# Altium footprint library Connectors_2,54mm.PcbLib: 400 footprints (part 15 of 26)
Each footprint in its own frame and in the unit in brackets; x right, y up, seen from the top. Pads: shape width x height; smd on the part's side, far side on the other; paste and mask are expansions set on the pad; w line width, h text height; cw(c..) or ccw(c..) is an arc to the next point about the centre after c.
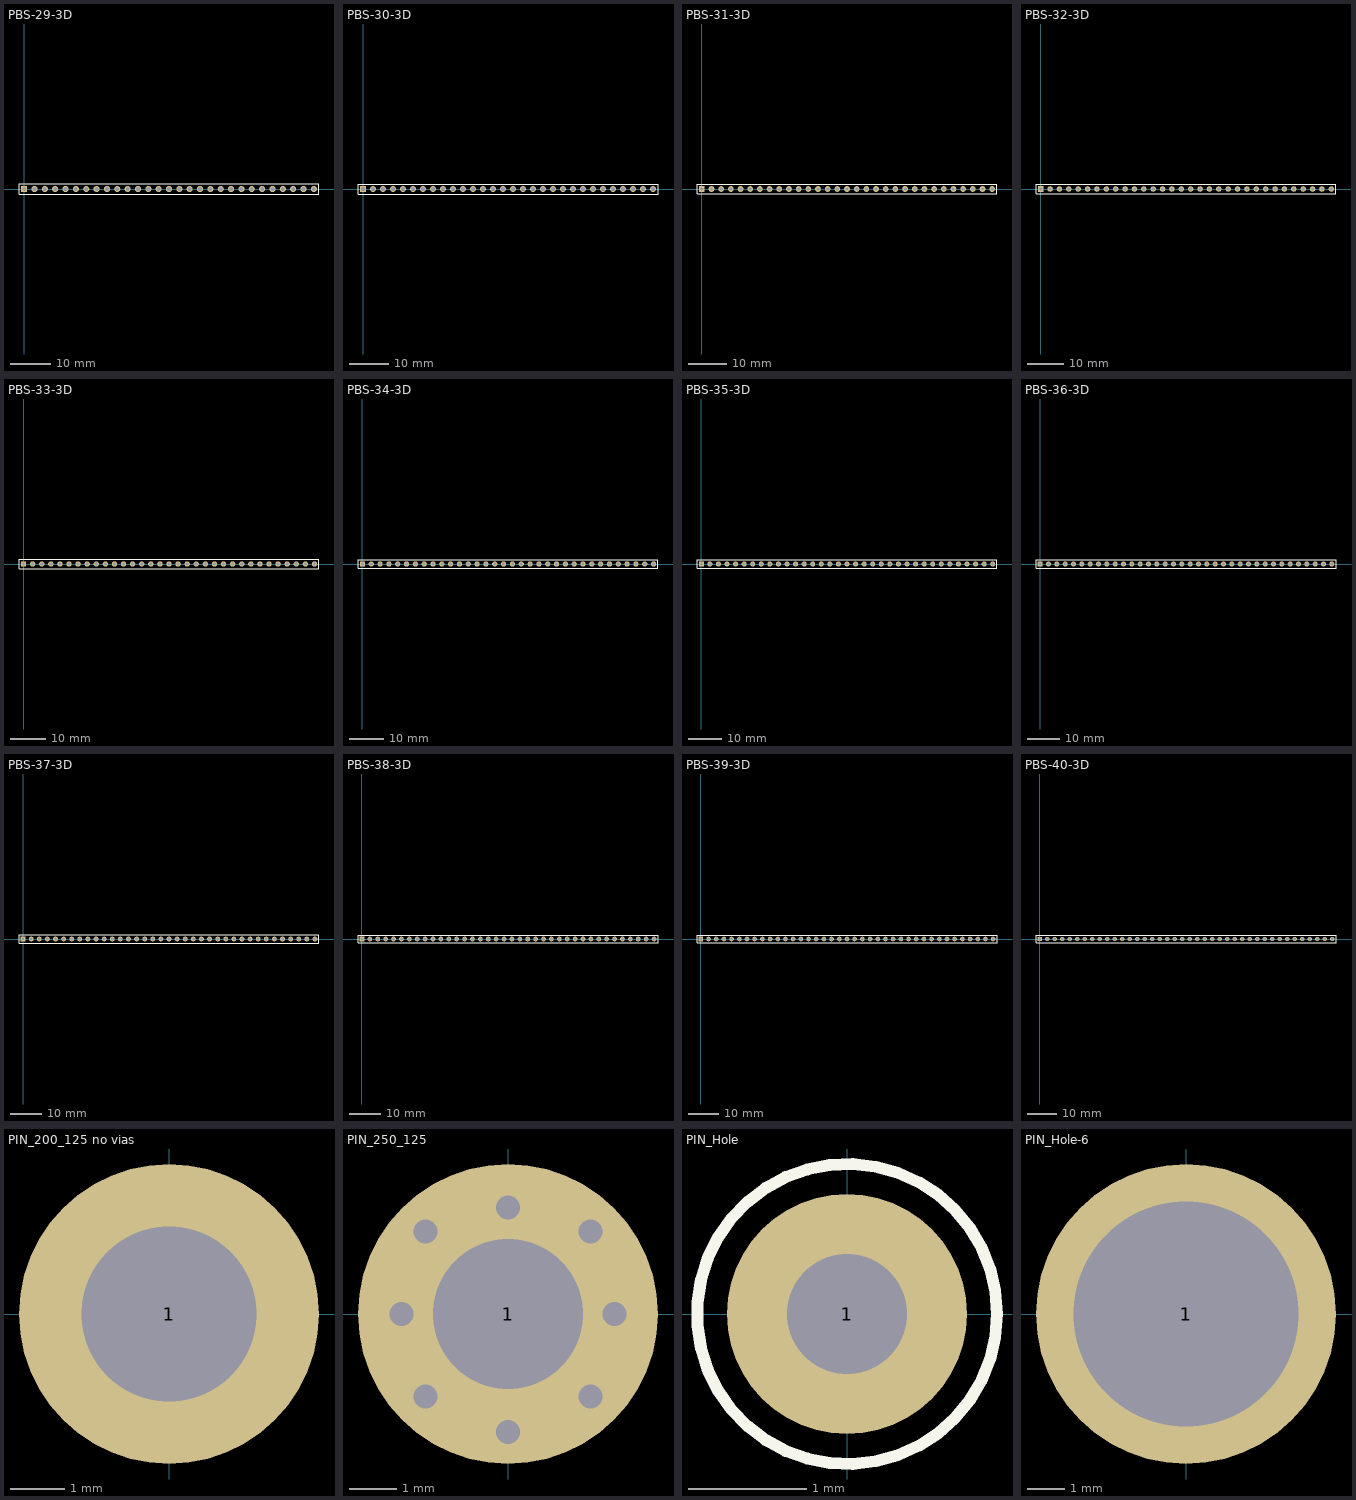
[diagram p14: the footprints below, top view; thin cyan lines are the x and y axes]

## PBS-29-3D [mm] "Connector; Header; 29 Position"
height 8
pads (29):
  rect 1.5x1.5 hole 0.9: 1(0,0)
  round 1.5 hole 0.9: 2(2.54,0) 3(5.08,0) 4(7.62,0) 5(10.16,0) 6(12.7,0) 7(15.24,0) 8(17.78,0) 9(20.32,0) 10(22.86,0) 11(25.4,0) 12(27.94,0) 13(30.48,0) 14(33.02,0) 15(35.56,0) 16(38.1,0) 17(40.64,0) 18(43.18,0) 19(45.72,0) 20(48.26,0) 21(50.8,0) 22(53.34,0) 23(55.88,0) 24(58.42,0) 25(60.96,0) 26(63.5,0) 27(66.04,0) 28(68.58,0) 29(71.12,0)
Top Overlay:
  lines w0.2: -1.27,-1.27 -1.27,1.27 72.39,1.27 72.39,-1.27 -1.27,-1.27
3D body "PBD-2.stp": height 8.5, standoff -3.15, extent 64.77,-1.27 69.85,1.27
3D body "PBD-2.stp": height 8.5, standoff -3.15, extent 59.69,-1.27 64.77,1.27
3D body "PBD-2.stp": height 8.5, standoff -3.15, extent 54.61,-1.27 59.69,1.27
3D body "PBD-2.stp": height 8.5, standoff -3.15, extent 49.53,-1.27 54.61,1.27
3D body "PBD-2.stp": height 8.5, standoff -3.15, extent 44.45,-1.27 49.53,1.27
3D body "PBD-2.stp": height 8.5, standoff -3.15, extent 39.37,-1.27 44.45,1.27
3D body "PBD-2.stp": height 8.5, standoff -3.15, extent 34.29,-1.27 39.37,1.27
3D body "PBD-2.stp": height 8.5, standoff -3.15, extent 29.21,-1.27 34.29,1.27
3D body "PBD-2.stp": height 8.5, standoff -3.15, extent 24.13,-1.27 29.21,1.27
3D body "PBD-2.stp": height 8.5, standoff -3.15, extent 19.05,-1.27 24.13,1.27
3D body "PBD-2.stp": height 8.5, standoff -3.15, extent 13.97,-1.27 19.05,1.27
3D body "PBD-2.stp": height 8.5, standoff -3.15, extent 8.89,-1.27 13.97,1.27
3D body "PBD-2.stp": height 8.5, standoff -3.15, extent 3.81,-1.27 8.89,1.27
3D body "PBD-2.stp": height 8.5, standoff -3.15, extent -1.27,-1.27 3.81,1.27
3D body "PBS-1.stp": height 8.5, standoff -3.15, extent 69.85,-1.27 72.39,1.27

## PBS-30-3D [mm] "Connector; Header; 30 Position"
height 8
pads (30):
  rect 1.5x1.5 hole 0.9: 1(0,0)
  round 1.5 hole 0.9: 2(2.54,0) 3(5.08,0) 4(7.62,0) 5(10.16,0) 6(12.7,0) 7(15.24,0) 8(17.78,0) 9(20.32,0) 10(22.86,0) 11(25.4,0) 12(27.94,0) 13(30.48,0) 14(33.02,0) 15(35.56,0) 16(38.1,0) 17(40.64,0) 18(43.18,0) 19(45.72,0) 20(48.26,0) 21(50.8,0) 22(53.34,0) 23(55.88,0) 24(58.42,0) 25(60.96,0) 26(63.5,0) 27(66.04,0) 28(68.58,0) 29(71.12,0) 30(73.66,0)
Top Overlay:
  lines w0.2: -1.27,-1.27 -1.27,1.27 74.93,1.27 74.93,-1.27 -1.27,-1.27
3D body "PBD-2.stp": height 8.5, standoff -3.15, extent 69.85,-1.27 74.93,1.27
3D body "PBD-2.stp": height 8.5, standoff -3.15, extent 64.77,-1.27 69.85,1.27
3D body "PBD-2.stp": height 8.5, standoff -3.15, extent 59.69,-1.27 64.77,1.27
3D body "PBD-2.stp": height 8.5, standoff -3.15, extent 54.61,-1.27 59.69,1.27
3D body "PBD-2.stp": height 8.5, standoff -3.15, extent 49.53,-1.27 54.61,1.27
3D body "PBD-2.stp": height 8.5, standoff -3.15, extent 44.45,-1.27 49.53,1.27
3D body "PBD-2.stp": height 8.5, standoff -3.15, extent 39.37,-1.27 44.45,1.27
3D body "PBD-2.stp": height 8.5, standoff -3.15, extent 34.29,-1.27 39.37,1.27
3D body "PBD-2.stp": height 8.5, standoff -3.15, extent 29.21,-1.27 34.29,1.27
3D body "PBD-2.stp": height 8.5, standoff -3.15, extent 24.13,-1.27 29.21,1.27
3D body "PBD-2.stp": height 8.5, standoff -3.15, extent 19.05,-1.27 24.13,1.27
3D body "PBD-2.stp": height 8.5, standoff -3.15, extent 13.97,-1.27 19.05,1.27
3D body "PBD-2.stp": height 8.5, standoff -3.15, extent 8.89,-1.27 13.97,1.27
3D body "PBD-2.stp": height 8.5, standoff -3.15, extent 3.81,-1.27 8.89,1.27
3D body "PBD-2.stp": height 8.5, standoff -3.15, extent -1.27,-1.27 3.81,1.27

## PBS-31-3D [mm] "Connector; Header; 31 Position"
height 8
pads (31):
  rect 1.5x1.5 hole 0.9: 1(0,0)
  round 1.5 hole 0.9: 2(2.54,0) 3(5.08,0) 4(7.62,0) 5(10.16,0) 6(12.7,0) 7(15.24,0) 8(17.78,0) 9(20.32,0) 10(22.86,0) 11(25.4,0) 12(27.94,0) 13(30.48,0) 14(33.02,0) 15(35.56,0) 16(38.1,0) 17(40.64,0) 18(43.18,0) 19(45.72,0) 20(48.26,0) 21(50.8,0) 22(53.34,0) 23(55.88,0) 24(58.42,0) 25(60.96,0) 26(63.5,0) 27(66.04,0) 28(68.58,0) 29(71.12,0) 30(73.66,0) 31(76.2,0)
Top Overlay:
  lines w0.2: -1.27,-1.27 -1.27,1.27 77.47,1.27 77.47,-1.27 -1.27,-1.27
3D body "PBD-2.stp": height 8.5, standoff -3.15, extent 69.85,-1.27 74.93,1.27
3D body "PBD-2.stp": height 8.5, standoff -3.15, extent 64.77,-1.27 69.85,1.27
3D body "PBD-2.stp": height 8.5, standoff -3.15, extent 59.69,-1.27 64.77,1.27
3D body "PBD-2.stp": height 8.5, standoff -3.15, extent 54.61,-1.27 59.69,1.27
3D body "PBD-2.stp": height 8.5, standoff -3.15, extent 49.53,-1.27 54.61,1.27
3D body "PBD-2.stp": height 8.5, standoff -3.15, extent 44.45,-1.27 49.53,1.27
3D body "PBD-2.stp": height 8.5, standoff -3.15, extent 39.37,-1.27 44.45,1.27
3D body "PBD-2.stp": height 8.5, standoff -3.15, extent 34.29,-1.27 39.37,1.27
3D body "PBD-2.stp": height 8.5, standoff -3.15, extent 29.21,-1.27 34.29,1.27
3D body "PBD-2.stp": height 8.5, standoff -3.15, extent 24.13,-1.27 29.21,1.27
3D body "PBD-2.stp": height 8.5, standoff -3.15, extent 19.05,-1.27 24.13,1.27
3D body "PBD-2.stp": height 8.5, standoff -3.15, extent 13.97,-1.27 19.05,1.27
3D body "PBD-2.stp": height 8.5, standoff -3.15, extent 8.89,-1.27 13.97,1.27
3D body "PBD-2.stp": height 8.5, standoff -3.15, extent 3.81,-1.27 8.89,1.27
3D body "PBD-2.stp": height 8.5, standoff -3.15, extent -1.27,-1.27 3.81,1.27
3D body "PBS-1.stp": height 8.5, standoff -3.15, extent 74.93,-1.27 77.47,1.27

## PBS-32-3D [mm] "Connector; Header; 32 Position"
height 8
pads (32):
  rect 1.5x1.5 hole 0.9: 1(0,0)
  round 1.5 hole 0.9: 2(2.54,0) 3(5.08,0) 4(7.62,0) 5(10.16,0) 6(12.7,0) 7(15.24,0) 8(17.78,0) 9(20.32,0) 10(22.86,0) 11(25.4,0) 12(27.94,0) 13(30.48,0) 14(33.02,0) 15(35.56,0) 16(38.1,0) 17(40.64,0) 18(43.18,0) 19(45.72,0) 20(48.26,0) 21(50.8,0) 22(53.34,0) 23(55.88,0) 24(58.42,0) 25(60.96,0) 26(63.5,0) 27(66.04,0) 28(68.58,0) 29(71.12,0) 30(73.66,0) 31(76.2,0) 32(78.74,0)
Top Overlay:
  lines w0.2: -1.27,-1.27 -1.27,1.27 80.01,1.27 80.01,-1.27 -1.27,-1.27
3D body "PBD-2.stp": height 8.5, standoff -3.15, extent 74.93,-1.27 80.01,1.27
3D body "PBD-2.stp": height 8.5, standoff -3.15, extent 69.85,-1.27 74.93,1.27
3D body "PBD-2.stp": height 8.5, standoff -3.15, extent 64.77,-1.27 69.85,1.27
3D body "PBD-2.stp": height 8.5, standoff -3.15, extent 59.69,-1.27 64.77,1.27
3D body "PBD-2.stp": height 8.5, standoff -3.15, extent 54.61,-1.27 59.69,1.27
3D body "PBD-2.stp": height 8.5, standoff -3.15, extent 49.53,-1.27 54.61,1.27
3D body "PBD-2.stp": height 8.5, standoff -3.15, extent 44.45,-1.27 49.53,1.27
3D body "PBD-2.stp": height 8.5, standoff -3.15, extent 39.37,-1.27 44.45,1.27
3D body "PBD-2.stp": height 8.5, standoff -3.15, extent 34.29,-1.27 39.37,1.27
3D body "PBD-2.stp": height 8.5, standoff -3.15, extent 29.21,-1.27 34.29,1.27
3D body "PBD-2.stp": height 8.5, standoff -3.15, extent 24.13,-1.27 29.21,1.27
3D body "PBD-2.stp": height 8.5, standoff -3.15, extent 19.05,-1.27 24.13,1.27
3D body "PBD-2.stp": height 8.5, standoff -3.15, extent 13.97,-1.27 19.05,1.27
3D body "PBD-2.stp": height 8.5, standoff -3.15, extent 8.89,-1.27 13.97,1.27
3D body "PBD-2.stp": height 8.5, standoff -3.15, extent 3.81,-1.27 8.89,1.27
3D body "PBD-2.stp": height 8.5, standoff -3.15, extent -1.27,-1.27 3.81,1.27

## PBS-33-3D [mm] "Connector; Header; 33 Position"
height 8
pads (33):
  rect 1.5x1.5 hole 0.9: 1(0,0)
  round 1.5 hole 0.9: 2(2.54,0) 3(5.08,0) 4(7.62,0) 5(10.16,0) 6(12.7,0) 7(15.24,0) 8(17.78,0) 9(20.32,0) 10(22.86,0) 11(25.4,0) 12(27.94,0) 13(30.48,0) 14(33.02,0) 15(35.56,0) 16(38.1,0) 17(40.64,0) 18(43.18,0) 19(45.72,0) 20(48.26,0) 21(50.8,0) 22(53.34,0) 23(55.88,0) 24(58.42,0) 25(60.96,0) 26(63.5,0) 27(66.04,0) 28(68.58,0) 29(71.12,0) 30(73.66,0) 31(76.2,0) 32(78.74,0) 33(81.28,0)
Top Overlay:
  lines w0.2: -1.27,-1.27 82.55,-1.27 82.55,1.27 -1.27,1.27 -1.27,-1.27
3D body "PBD-2.stp": height 8.5, standoff -3.15, extent 74.93,-1.27 80.01,1.27
3D body "PBD-2.stp": height 8.5, standoff -3.15, extent 69.85,-1.27 74.93,1.27
3D body "PBD-2.stp": height 8.5, standoff -3.15, extent 64.77,-1.27 69.85,1.27
3D body "PBD-2.stp": height 8.5, standoff -3.15, extent 59.69,-1.27 64.77,1.27
3D body "PBD-2.stp": height 8.5, standoff -3.15, extent 54.61,-1.27 59.69,1.27
3D body "PBD-2.stp": height 8.5, standoff -3.15, extent 49.53,-1.27 54.61,1.27
3D body "PBD-2.stp": height 8.5, standoff -3.15, extent 44.45,-1.27 49.53,1.27
3D body "PBD-2.stp": height 8.5, standoff -3.15, extent 39.37,-1.27 44.45,1.27
3D body "PBD-2.stp": height 8.5, standoff -3.15, extent 34.29,-1.27 39.37,1.27
3D body "PBD-2.stp": height 8.5, standoff -3.15, extent 29.21,-1.27 34.29,1.27
3D body "PBD-2.stp": height 8.5, standoff -3.15, extent 24.13,-1.27 29.21,1.27
3D body "PBD-2.stp": height 8.5, standoff -3.15, extent 19.05,-1.27 24.13,1.27
3D body "PBD-2.stp": height 8.5, standoff -3.15, extent 13.97,-1.27 19.05,1.27
3D body "PBD-2.stp": height 8.5, standoff -3.15, extent 8.89,-1.27 13.97,1.27
3D body "PBD-2.stp": height 8.5, standoff -3.15, extent 3.81,-1.27 8.89,1.27
3D body "PBD-2.stp": height 8.5, standoff -3.15, extent -1.27,-1.27 3.81,1.27
3D body "PBS-1.stp": height 8.5, standoff -3.15, extent 80.01,-1.27 82.55,1.27

## PBS-34-3D [mm] "Connector; Header; 34 Position"
height 8
pads (34):
  rect 1.5x1.5 hole 0.9: 1(0,0)
  round 1.5 hole 0.9: 2(2.54,0) 3(5.08,0) 4(7.62,0) 5(10.16,0) 6(12.7,0) 7(15.24,0) 8(17.78,0) 9(20.32,0) 10(22.86,0) 11(25.4,0) 12(27.94,0) 13(30.48,0) 14(33.02,0) 15(35.56,0) 16(38.1,0) 17(40.64,0) 18(43.18,0) 19(45.72,0) 20(48.26,0) 21(50.8,0) 22(53.34,0) 23(55.88,0) 24(58.42,0) 25(60.96,0) 26(63.5,0) 27(66.04,0) 28(68.58,0) 29(71.12,0) 30(73.66,0) 31(76.2,0) 32(78.74,0) 33(81.28,0) 34(83.82,0)
Top Overlay:
  lines w0.2: -1.27,-1.27 -1.27,1.27 85.09,1.27 85.09,-1.27 -1.27,-1.27
3D body "PBD-2.stp": height 8.5, standoff -3.15, extent 80.01,-1.27 85.09,1.27
3D body "PBD-2.stp": height 8.5, standoff -3.15, extent 74.93,-1.27 80.01,1.27
3D body "PBD-2.stp": height 8.5, standoff -3.15, extent 69.85,-1.27 74.93,1.27
3D body "PBD-2.stp": height 8.5, standoff -3.15, extent 64.77,-1.27 69.85,1.27
3D body "PBD-2.stp": height 8.5, standoff -3.15, extent 59.69,-1.27 64.77,1.27
3D body "PBD-2.stp": height 8.5, standoff -3.15, extent 54.61,-1.27 59.69,1.27
3D body "PBD-2.stp": height 8.5, standoff -3.15, extent 49.53,-1.27 54.61,1.27
3D body "PBD-2.stp": height 8.5, standoff -3.15, extent 44.45,-1.27 49.53,1.27
3D body "PBD-2.stp": height 8.5, standoff -3.15, extent 39.37,-1.27 44.45,1.27
3D body "PBD-2.stp": height 8.5, standoff -3.15, extent 34.29,-1.27 39.37,1.27
3D body "PBD-2.stp": height 8.5, standoff -3.15, extent 29.21,-1.27 34.29,1.27
3D body "PBD-2.stp": height 8.5, standoff -3.15, extent 24.13,-1.27 29.21,1.27
3D body "PBD-2.stp": height 8.5, standoff -3.15, extent 19.05,-1.27 24.13,1.27
3D body "PBD-2.stp": height 8.5, standoff -3.15, extent 13.97,-1.27 19.05,1.27
3D body "PBD-2.stp": height 8.5, standoff -3.15, extent 8.89,-1.27 13.97,1.27
3D body "PBD-2.stp": height 8.5, standoff -3.15, extent 3.81,-1.27 8.89,1.27
3D body "PBD-2.stp": height 8.5, standoff -3.15, extent -1.27,-1.27 3.81,1.27

## PBS-35-3D [mm] "Connector; Header; 35 Position"
height 8
pads (35):
  rect 1.5x1.5 hole 0.9: 1(0,0)
  round 1.5 hole 0.9: 2(2.54,0) 3(5.08,0) 4(7.62,0) 5(10.16,0) 6(12.7,0) 7(15.24,0) 8(17.78,0) 9(20.32,0) 10(22.86,0) 11(25.4,0) 12(27.94,0) 13(30.48,0) 14(33.02,0) 15(35.56,0) 16(38.1,0) 17(40.64,0) 18(43.18,0) 19(45.72,0) 20(48.26,0) 21(50.8,0) 22(53.34,0) 23(55.88,0) 24(58.42,0) 25(60.96,0) 26(63.5,0) 27(66.04,0) 28(68.58,0) 29(71.12,0) 30(73.66,0) 31(76.2,0) 32(78.74,0) 33(81.28,0) 34(83.82,0) 35(86.36,0)
Top Overlay:
  lines w0.2: -1.27,-1.27 -1.27,1.27 87.63,1.27 87.63,-1.27 -1.27,-1.27
3D body "PBD-2.stp": height 8.5, standoff -3.15, extent 80.01,-1.27 85.09,1.27
3D body "PBD-2.stp": height 8.5, standoff -3.15, extent 74.93,-1.27 80.01,1.27
3D body "PBD-2.stp": height 8.5, standoff -3.15, extent 69.85,-1.27 74.93,1.27
3D body "PBD-2.stp": height 8.5, standoff -3.15, extent 64.77,-1.27 69.85,1.27
3D body "PBD-2.stp": height 8.5, standoff -3.15, extent 59.69,-1.27 64.77,1.27
3D body "PBD-2.stp": height 8.5, standoff -3.15, extent 54.61,-1.27 59.69,1.27
3D body "PBD-2.stp": height 8.5, standoff -3.15, extent 49.53,-1.27 54.61,1.27
3D body "PBD-2.stp": height 8.5, standoff -3.15, extent 44.45,-1.27 49.53,1.27
3D body "PBD-2.stp": height 8.5, standoff -3.15, extent 39.37,-1.27 44.45,1.27
3D body "PBD-2.stp": height 8.5, standoff -3.15, extent 34.29,-1.27 39.37,1.27
3D body "PBD-2.stp": height 8.5, standoff -3.15, extent 29.21,-1.27 34.29,1.27
3D body "PBD-2.stp": height 8.5, standoff -3.15, extent 24.13,-1.27 29.21,1.27
3D body "PBD-2.stp": height 8.5, standoff -3.15, extent 19.05,-1.27 24.13,1.27
3D body "PBD-2.stp": height 8.5, standoff -3.15, extent 13.97,-1.27 19.05,1.27
3D body "PBD-2.stp": height 8.5, standoff -3.15, extent 8.89,-1.27 13.97,1.27
3D body "PBD-2.stp": height 8.5, standoff -3.15, extent 3.81,-1.27 8.89,1.27
3D body "PBD-2.stp": height 8.5, standoff -3.15, extent -1.27,-1.27 3.81,1.27
3D body "PBS-1.stp": height 8.5, standoff -3.15, extent 85.09,-1.27 87.63,1.27

## PBS-36-3D [mm] "Connector; Header; 36 Position"
height 8
pads (36):
  rect 1.5x1.5 hole 0.9: 1(0,0)
  round 1.5 hole 0.9: 2(2.54,0) 3(5.08,0) 4(7.62,0) 5(10.16,0) 6(12.7,0) 7(15.24,0) 8(17.78,0) 9(20.32,0) 10(22.86,0) 11(25.4,0) 12(27.94,0) 13(30.48,0) 14(33.02,0) 15(35.56,0) 16(38.1,0) 17(40.64,0) 18(43.18,0) 19(45.72,0) 20(48.26,0) 21(50.8,0) 22(53.34,0) 23(55.88,0) 24(58.42,0) 25(60.96,0) 26(63.5,0) 27(66.04,0) 28(68.58,0) 29(71.12,0) 30(73.66,0) 31(76.2,0) 32(78.74,0) 33(81.28,0) 34(83.82,0) 35(86.36,0) 36(88.9,0)
Top Overlay:
  lines w0.2: -1.27,-1.27 -1.27,1.27 90.17,1.27 90.17,-1.27 -1.27,-1.27
3D body "PBD-2.stp": height 8.5, standoff -3.15, extent 85.09,-1.27 90.17,1.27
3D body "PBD-2.stp": height 8.5, standoff -3.15, extent 80.01,-1.27 85.09,1.27
3D body "PBD-2.stp": height 8.5, standoff -3.15, extent 74.93,-1.27 80.01,1.27
3D body "PBD-2.stp": height 8.5, standoff -3.15, extent 69.85,-1.27 74.93,1.27
3D body "PBD-2.stp": height 8.5, standoff -3.15, extent 64.77,-1.27 69.85,1.27
3D body "PBD-2.stp": height 8.5, standoff -3.15, extent 59.69,-1.27 64.77,1.27
3D body "PBD-2.stp": height 8.5, standoff -3.15, extent 54.61,-1.27 59.69,1.27
3D body "PBD-2.stp": height 8.5, standoff -3.15, extent 49.53,-1.27 54.61,1.27
3D body "PBD-2.stp": height 8.5, standoff -3.15, extent 44.45,-1.27 49.53,1.27
3D body "PBD-2.stp": height 8.5, standoff -3.15, extent 39.37,-1.27 44.45,1.27
3D body "PBD-2.stp": height 8.5, standoff -3.15, extent 34.29,-1.27 39.37,1.27
3D body "PBD-2.stp": height 8.5, standoff -3.15, extent 29.21,-1.27 34.29,1.27
3D body "PBD-2.stp": height 8.5, standoff -3.15, extent 24.13,-1.27 29.21,1.27
3D body "PBD-2.stp": height 8.5, standoff -3.15, extent 19.05,-1.27 24.13,1.27
3D body "PBD-2.stp": height 8.5, standoff -3.15, extent 13.97,-1.27 19.05,1.27
3D body "PBD-2.stp": height 8.5, standoff -3.15, extent 8.89,-1.27 13.97,1.27
3D body "PBD-2.stp": height 8.5, standoff -3.15, extent 3.81,-1.27 8.89,1.27
3D body "PBD-2.stp": height 8.5, standoff -3.15, extent -1.27,-1.27 3.81,1.27

## PBS-37-3D [mm] "Connector; Header; 37 Position"
height 8
pads (37):
  rect 1.5x1.5 hole 0.9: 1(0,0)
  round 1.5 hole 0.9: 2(2.54,0) 3(5.08,0) 4(7.62,0) 5(10.16,0) 6(12.7,0) 7(15.24,0) 8(17.78,0) 9(20.32,0) 10(22.86,0) 11(25.4,0) 12(27.94,0) 13(30.48,0) 14(33.02,0) 15(35.56,0) 16(38.1,0) 17(40.64,0) 18(43.18,0) 19(45.72,0) 20(48.26,0) 21(50.8,0) 22(53.34,0) 23(55.88,0) 24(58.42,0) 25(60.96,0) 26(63.5,0) 27(66.04,0) 28(68.58,0) 29(71.12,0) 30(73.66,0) 31(76.2,0) 32(78.74,0) 33(81.28,0) 34(83.82,0) 35(86.36,0) 36(88.9,0) 37(91.44,0)
Top Overlay:
  lines w0.2: -1.27,-1.27 92.71,-1.27 92.71,1.27 -1.27,1.27 -1.27,-1.27
3D body "PBS-1.stp": height 8.5, standoff -3.15, extent 90.17,-1.27 92.71,1.27
3D body "PBD-2.stp": height 8.5, standoff -3.15, extent -1.27,-1.27 3.81,1.27
3D body "PBD-2.stp": height 8.5, standoff -3.15, extent 3.81,-1.27 8.89,1.27
3D body "PBD-2.stp": height 8.5, standoff -3.15, extent 8.89,-1.27 13.97,1.27
3D body "PBD-2.stp": height 8.5, standoff -3.15, extent 13.97,-1.27 19.05,1.27
3D body "PBD-2.stp": height 8.5, standoff -3.15, extent 19.05,-1.27 24.13,1.27
3D body "PBD-2.stp": height 8.5, standoff -3.15, extent 24.13,-1.27 29.21,1.27
3D body "PBD-2.stp": height 8.5, standoff -3.15, extent 29.21,-1.27 34.29,1.27
3D body "PBD-2.stp": height 8.5, standoff -3.15, extent 34.29,-1.27 39.37,1.27
3D body "PBD-2.stp": height 8.5, standoff -3.15, extent 39.37,-1.27 44.45,1.27
3D body "PBD-2.stp": height 8.5, standoff -3.15, extent 44.45,-1.27 49.53,1.27
3D body "PBD-2.stp": height 8.5, standoff -3.15, extent 49.53,-1.27 54.61,1.27
3D body "PBD-2.stp": height 8.5, standoff -3.15, extent 54.61,-1.27 59.69,1.27
3D body "PBD-2.stp": height 8.5, standoff -3.15, extent 59.69,-1.27 64.77,1.27
3D body "PBD-2.stp": height 8.5, standoff -3.15, extent 64.77,-1.27 69.85,1.27
3D body "PBD-2.stp": height 8.5, standoff -3.15, extent 69.85,-1.27 74.93,1.27
3D body "PBD-2.stp": height 8.5, standoff -3.15, extent 74.93,-1.27 80.01,1.27
3D body "PBD-2.stp": height 8.5, standoff -3.15, extent 80.01,-1.27 85.09,1.27
3D body "PBD-2.stp": height 8.5, standoff -3.15, extent 85.09,-1.27 90.17,1.27

## PBS-38-3D [mm] "Connector; Header; 38 Position"
height 8
pads (38):
  rect 1.5x1.5 hole 0.9: 1(0,0)
  round 1.5 hole 0.9: 2(2.54,0) 3(5.08,0) 4(7.62,0) 5(10.16,0) 6(12.7,0) 7(15.24,0) 8(17.78,0) 9(20.32,0) 10(22.86,0) 11(25.4,0) 12(27.94,0) 13(30.48,0) 14(33.02,0) 15(35.56,0) 16(38.1,0) 17(40.64,0) 18(43.18,0) 19(45.72,0) 20(48.26,0) 21(50.8,0) 22(53.34,0) 23(55.88,0) 24(58.42,0) 25(60.96,0) 26(63.5,0) 27(66.04,0) 28(68.58,0) 29(71.12,0) 30(73.66,0) 31(76.2,0) 32(78.74,0) 33(81.28,0) 34(83.82,0) 35(86.36,0) 36(88.9,0) 37(91.44,0) 38(93.98,0)
Top Overlay:
  lines w0.2: -1.27,-1.27 95.25,-1.27 95.25,1.27 -1.27,1.27 -1.27,-1.27
3D body "PBD-2.stp": height 8.5, standoff -3.15, extent 90.17,-1.27 95.25,1.27
3D body "PBD-2.stp": height 8.5, standoff -3.15, extent 85.09,-1.27 90.17,1.27
3D body "PBD-2.stp": height 8.5, standoff -3.15, extent 80.01,-1.27 85.09,1.27
3D body "PBD-2.stp": height 8.5, standoff -3.15, extent 74.93,-1.27 80.01,1.27
3D body "PBD-2.stp": height 8.5, standoff -3.15, extent 69.85,-1.27 74.93,1.27
3D body "PBD-2.stp": height 8.5, standoff -3.15, extent 64.77,-1.27 69.85,1.27
3D body "PBD-2.stp": height 8.5, standoff -3.15, extent 59.69,-1.27 64.77,1.27
3D body "PBD-2.stp": height 8.5, standoff -3.15, extent 54.61,-1.27 59.69,1.27
3D body "PBD-2.stp": height 8.5, standoff -3.15, extent 49.53,-1.27 54.61,1.27
3D body "PBD-2.stp": height 8.5, standoff -3.15, extent 44.45,-1.27 49.53,1.27
3D body "PBD-2.stp": height 8.5, standoff -3.15, extent 39.37,-1.27 44.45,1.27
3D body "PBD-2.stp": height 8.5, standoff -3.15, extent 34.29,-1.27 39.37,1.27
3D body "PBD-2.stp": height 8.5, standoff -3.15, extent 29.21,-1.27 34.29,1.27
3D body "PBD-2.stp": height 8.5, standoff -3.15, extent 24.13,-1.27 29.21,1.27
3D body "PBD-2.stp": height 8.5, standoff -3.15, extent 19.05,-1.27 24.13,1.27
3D body "PBD-2.stp": height 8.5, standoff -3.15, extent 13.97,-1.27 19.05,1.27
3D body "PBD-2.stp": height 8.5, standoff -3.15, extent 8.89,-1.27 13.97,1.27
3D body "PBD-2.stp": height 8.5, standoff -3.15, extent 3.81,-1.27 8.89,1.27
3D body "PBD-2.stp": height 8.5, standoff -3.15, extent -1.27,-1.27 3.81,1.27

## PBS-39-3D [mm] "Connector; Header; 39 Position"
height 8
pads (39):
  rect 1.5x1.5 hole 0.9: 1(0,0)
  round 1.5 hole 0.9: 2(2.54,0) 3(5.08,0) 4(7.62,0) 5(10.16,0) 6(12.7,0) 7(15.24,0) 8(17.78,0) 9(20.32,0) 10(22.86,0) 11(25.4,0) 12(27.94,0) 13(30.48,0) 14(33.02,0) 15(35.56,0) 16(38.1,0) 17(40.64,0) 18(43.18,0) 19(45.72,0) 20(48.26,0) 21(50.8,0) 22(53.34,0) 23(55.88,0) 24(58.42,0) 25(60.96,0) 26(63.5,0) 27(66.04,0) 28(68.58,0) 29(71.12,0) 30(73.66,0) 31(76.2,0) 32(78.74,0) 33(81.28,0) 34(83.82,0) 35(86.36,0) 36(88.9,0) 37(91.44,0) 38(93.98,0) 39(96.52,0)
Top Overlay:
  lines w0.2: -1.27,-1.27 97.79,-1.27 97.79,1.27 -1.27,1.27 -1.27,-1.27
3D body "PBD-2.stp": height 8.5, standoff -3.15, extent 90.17,-1.27 95.25,1.27
3D body "PBD-2.stp": height 8.5, standoff -3.15, extent 85.09,-1.27 90.17,1.27
3D body "PBD-2.stp": height 8.5, standoff -3.15, extent 80.01,-1.27 85.09,1.27
3D body "PBD-2.stp": height 8.5, standoff -3.15, extent 74.93,-1.27 80.01,1.27
3D body "PBD-2.stp": height 8.5, standoff -3.15, extent 69.85,-1.27 74.93,1.27
3D body "PBD-2.stp": height 8.5, standoff -3.15, extent 64.77,-1.27 69.85,1.27
3D body "PBD-2.stp": height 8.5, standoff -3.15, extent 59.69,-1.27 64.77,1.27
3D body "PBD-2.stp": height 8.5, standoff -3.15, extent 54.61,-1.27 59.69,1.27
3D body "PBD-2.stp": height 8.5, standoff -3.15, extent 49.53,-1.27 54.61,1.27
3D body "PBD-2.stp": height 8.5, standoff -3.15, extent 44.45,-1.27 49.53,1.27
3D body "PBD-2.stp": height 8.5, standoff -3.15, extent 39.37,-1.27 44.45,1.27
3D body "PBD-2.stp": height 8.5, standoff -3.15, extent 34.29,-1.27 39.37,1.27
3D body "PBD-2.stp": height 8.5, standoff -3.15, extent 29.21,-1.27 34.29,1.27
3D body "PBD-2.stp": height 8.5, standoff -3.15, extent 24.13,-1.27 29.21,1.27
3D body "PBD-2.stp": height 8.5, standoff -3.15, extent 19.05,-1.27 24.13,1.27
3D body "PBD-2.stp": height 8.5, standoff -3.15, extent 13.97,-1.27 19.05,1.27
3D body "PBD-2.stp": height 8.5, standoff -3.15, extent 8.89,-1.27 13.97,1.27
3D body "PBD-2.stp": height 8.5, standoff -3.15, extent 3.81,-1.27 8.89,1.27
3D body "PBD-2.stp": height 8.5, standoff -3.15, extent -1.27,-1.27 3.81,1.27
3D body "PBS-1.stp": height 8.5, standoff -3.15, extent 95.25,-1.27 97.79,1.27

## PBS-40-3D [mm] "Connector; Header; 40 Position"
height 8
pads (40):
  rect 1.5x1.5 hole 0.9: 1(0,0)
  round 1.5 hole 0.9: 2(2.54,0) 3(5.08,0) 4(7.62,0) 5(10.16,0) 6(12.7,0) 7(15.24,0) 8(17.78,0) 9(20.32,0) 10(22.86,0) 11(25.4,0) 12(27.94,0) 13(30.48,0) 14(33.02,0) 15(35.56,0) 16(38.1,0) 17(40.64,0) 18(43.18,0) 19(45.72,0) 20(48.26,0) 21(50.8,0) 22(53.34,0) 23(55.88,0) 24(58.42,0) 25(60.96,0) 26(63.5,0) 27(66.04,0) 28(68.58,0) 29(71.12,0) 30(73.66,0) 31(76.2,0) 32(78.74,0) 33(81.28,0) 34(83.82,0) 35(86.36,0) 36(88.9,0) 37(91.44,0) 38(93.98,0) 39(96.52,0) 40(99.06,0)
Top Overlay:
  lines w0.2: -1.27,-1.27 -1.27,1.27 100.33,1.27 100.33,-1.27 -1.27,-1.27
3D body "PBD-2.stp": height 8.5, standoff -3.15, extent 95.25,-1.27 100.33,1.27
3D body "PBD-2.stp": height 8.5, standoff -3.15, extent 90.17,-1.27 95.25,1.27
3D body "PBD-2.stp": height 8.5, standoff -3.15, extent 85.09,-1.27 90.17,1.27
3D body "PBD-2.stp": height 8.5, standoff -3.15, extent 80.01,-1.27 85.09,1.27
3D body "PBD-2.stp": height 8.5, standoff -3.15, extent 74.93,-1.27 80.01,1.27
3D body "PBD-2.stp": height 8.5, standoff -3.15, extent 69.85,-1.27 74.93,1.27
3D body "PBD-2.stp": height 8.5, standoff -3.15, extent 64.77,-1.27 69.85,1.27
3D body "PBD-2.stp": height 8.5, standoff -3.15, extent 59.69,-1.27 64.77,1.27
3D body "PBD-2.stp": height 8.5, standoff -3.15, extent 54.61,-1.27 59.69,1.27
3D body "PBD-2.stp": height 8.5, standoff -3.15, extent 49.53,-1.27 54.61,1.27
3D body "PBD-2.stp": height 8.5, standoff -3.15, extent 44.45,-1.27 49.53,1.27
3D body "PBD-2.stp": height 8.5, standoff -3.15, extent 39.37,-1.27 44.45,1.27
3D body "PBD-2.stp": height 8.5, standoff -3.15, extent 34.29,-1.27 39.37,1.27
3D body "PBD-2.stp": height 8.5, standoff -3.15, extent 29.21,-1.27 34.29,1.27
3D body "PBD-2.stp": height 8.5, standoff -3.15, extent 24.13,-1.27 29.21,1.27
3D body "PBD-2.stp": height 8.5, standoff -3.15, extent 19.05,-1.27 24.13,1.27
3D body "PBD-2.stp": height 8.5, standoff -3.15, extent 13.97,-1.27 19.05,1.27
3D body "PBD-2.stp": height 8.5, standoff -3.15, extent 8.89,-1.27 13.97,1.27
3D body "PBD-2.stp": height 8.5, standoff -3.15, extent 3.81,-1.27 8.89,1.27
3D body "PBD-2.stp": height 8.5, standoff -3.15, extent -1.27,-1.27 3.81,1.27

## PIN_200_125 no vias [mm]
height 0.01
pads (1):
  round 5.5 hole 3.2: 1(0,0)

## PIN_250_125 [mm]
height 0.01
pads (1):
  round 6.35 hole 3.175: 1(0,0)
via 1.75,-1.75 diameter 0.889 hole 0.508
via -1.75,-1.75 diameter 0.889 hole 0.508
via -1.75,1.75 diameter 0.889 hole 0.508
via 1.75,1.75 diameter 0.889 hole 0.508
via 0,-2.5 diameter 0.889 hole 0.508
via 0,2.25 diameter 0.889 hole 0.508
via 2.25,0 diameter 0.889 hole 0.508
via -2.25,0 diameter 0.889 hole 0.508

## PIN_Hole [mil] "Pin for PS1_module (FOX G20)"
height 1
pads (1):
  round 80 hole 40: 1(0,0)
Top Overlay:
  circle w3.94: c0,0 r50

## PIN_Hole-6 [mm]
height 0.025
pads (1):
  round 8 hole 6: 1(0,0)